# Altium schematic symbol library lib_datalogger.SchLib: 1246 symbols (part 5 of 16) (continued)
## CMP-007-00028-2 (continued)

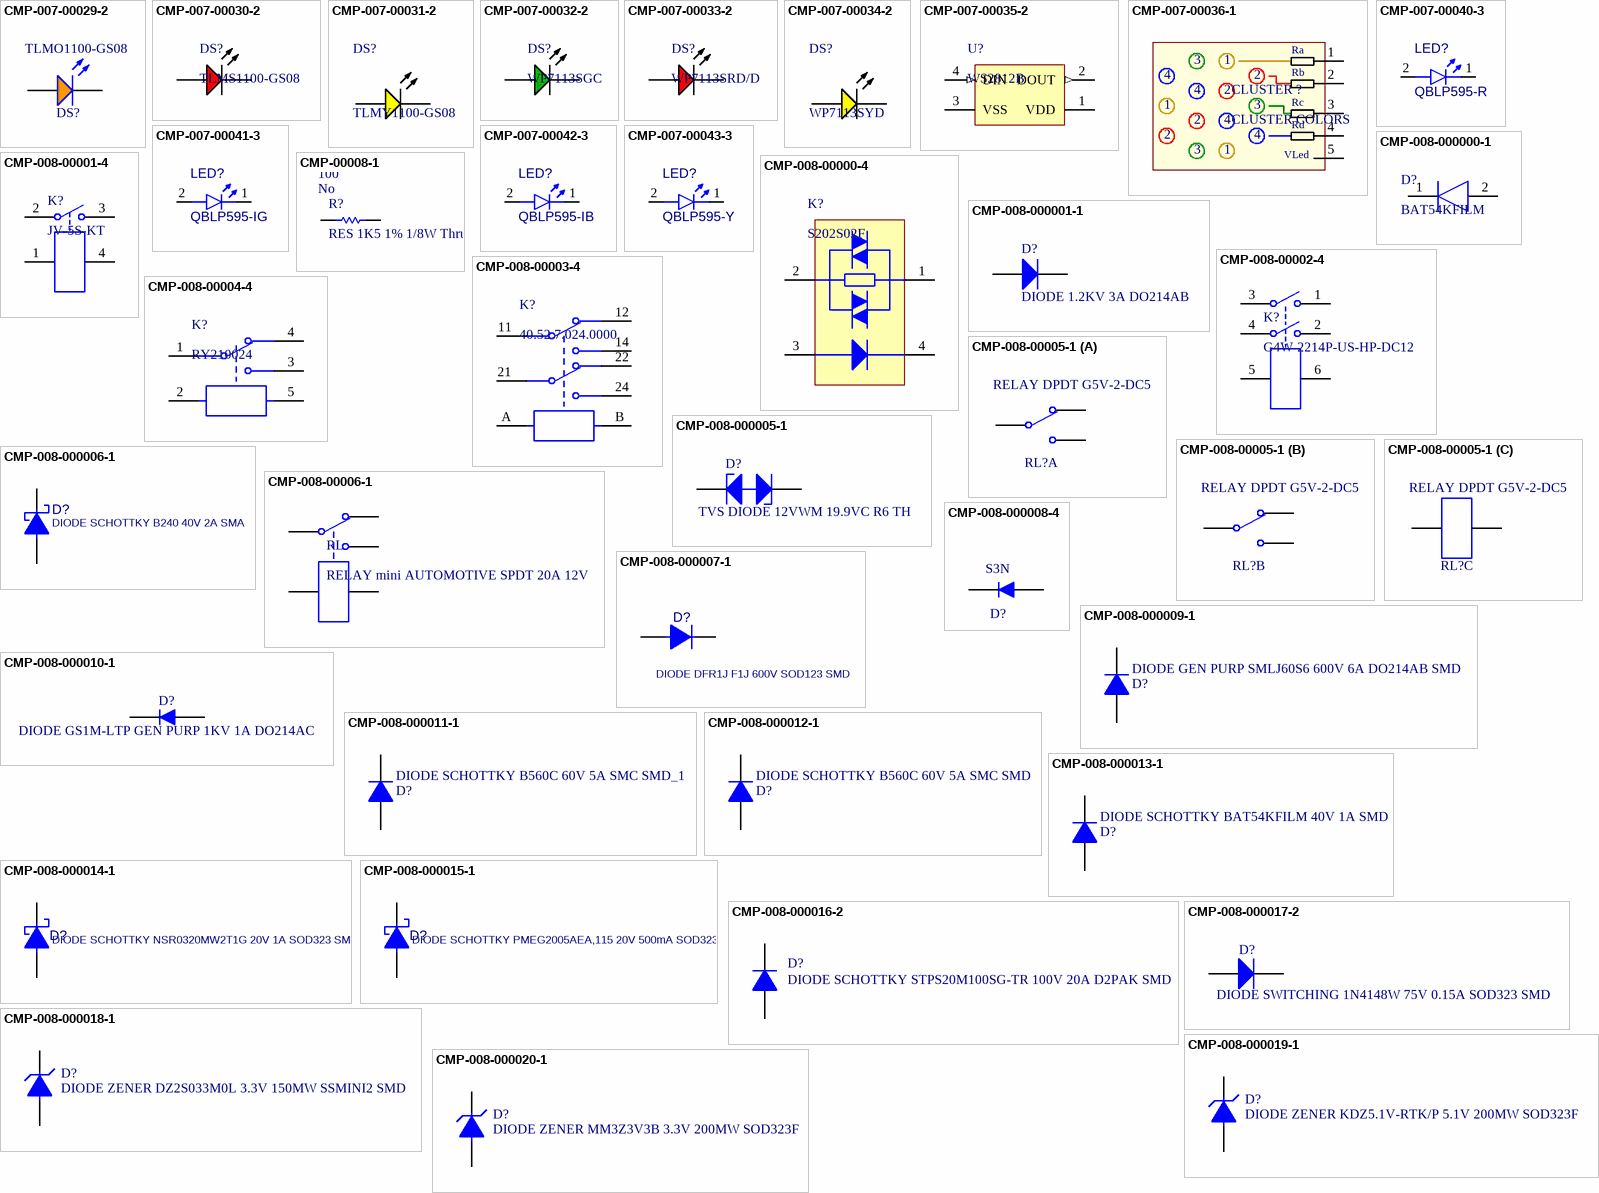
[diagram p15: symbols CMP-007-00029-2 to CMP-008-000020-1]

## CMP-007-00029-2
designator DS?, comment TLMO1100-GS08
Orange LED, 20 mA, 2.1 V, -40 to 100 degC, 2-Pin SMD (0603), RoHS, Tape and Reel; Manufacturer: Vishay Semiconductor; Lens Style: Diffused; Forward Current: 20mA; Viewing Angle: 160degrees; Nominal Vf: 2.1V; Power: 90mW; Luminous Intensity: 80mcd; Max Operating Temperature: 100°C; Manufacturer URL: http://www.vishay.com/; Datasheet URL: http://download.siliconexpert.com/pdfs/2016/8/7/12/43/26/667/vsh_/manual/379263299541529tlmb1100.pdf; Datasheet Version: Rev. 2.7, 03/2016; Illumination Colour: Orange; Package Quantity: 3000; Package Reference: 0603; Pins: 2; Min Operating Temperature: -40°C; Package Description: 2-Pin Surface Mount Device, Body 1.6 x 0.8 mm; RoHS Compliant: True; Case/Package: 0603; Mounting Technology: SM; Colour: Orange; Packaging: TapeandReel; Forward Voltage: 2.1V
footprint VISH-TLMX1100-2_V (SMD, 2-Leads, Body 1.6x0.8mm)
pins: 1 A, 2 K

## CMP-007-00030-2
designator DS?, comment TLMS1100-GS08
Red Led, 20mA, 2.1 V, -40 to 100 degC, 2-Pin SMD (0603), RoHS, Tape and Reel; Manufacturer: Vishay Semiconductor; Viewing Angle: 160degrees; Forward Voltage: 2.1V; Lens Style: Clear; Power: 90mW; Luminous Intensity: 63mcd; Datasheet Version: Rev. 2.7, 03/2016; Package Quantity: 3000; Colour: Red; Package Description: 2-Pin Surface Mount Device, Body 1.6 x 0.8 mm; Datasheet URL: http://www.vishay.com/docs/83173/tlmb1100.pdf; Package Reference: TLMX1100; Max Operating Temperature: 100°C; Mounting Technology: SM; Packaging: TapeandReel; Case/Package: 0603; Illumination Colour: Red; Forward Current: 20mA; Manufacturer URL: http://www.vishay.com/; RoHS Compliant: True; Min Operating Temperature: -40°C; Nominal Vf: 2.1V; Pins: 2
footprint VISH-TLMX1100_V (SMD, 2-Leads, Body 1.6x0.8mm)
pins: 1 A, 2 K

## CMP-007-00031-2
designator DS?, comment TLMY1100-GS08
Yellow LED, 20 mA, 2.1 V, -40 to 100 degC, 2-Pin SMD (0603), RoHS, Tape and Reel; Manufacturer: Vishay Semiconductor; Power: 90mW; Lens Style: Diffused; Nominal Vf: 2.1V; Forward Current: 20mA; Luminous Intensity: 80mcd; Viewing Angle: 160degrees; Manufacturer URL: http://www.vishay.com/; Package Reference: 0603; Packaging: TapeandReel; Case/Package: 0603; Datasheet Version: Rev. 2.7, 03/2016; Package Quantity: 3000; Forward Voltage: 2.1V; RoHS Compliant: True; Mounting Technology: SM; Datasheet URL: http://download.siliconexpert.com/pdfs/2016/8/7/12/43/26/667/vsh_/manual/379263299541529tlmb1100.pdf; Min Operating Temperature: -40°C; Pins: 2; Package Description: 2-Pin Surface Mount Device, Body 1.6 x 0.8 mm; Colour: Yellow; Max Operating Temperature: 100°C; Illumination Colour: Yellow
footprint VISH-TLMX1100-2_V (SMD, 2-Leads, Body 1.6x0.8mm)
pins: 1 A, 2 K

## CMP-007-00032-2
designator DS?, comment WP7113SGC
The Super Bright Green Source Color Device, 2.2 V, -40 to 85 degC, 2-Pin THD, RoHS, Tape and Reel; Manufacturer: Kingbright; Luminous Intensity: 200mcd; Nominal Vf: 2.2V; Viewing Angle: 20degrees; Lens Style: Clear; Mounting Technology: TH; Forward Voltage: 2.2V; Colour: Green; Package Quantity: 1000; Datasheet Version: Rev. 9B, 01/2015; RoHS Compliant: True; Case/Package: Radial; Package Description: 2-Pin Through Hole Device, Dia 5.9 mm, Body Length 8.6 mm; Packaging: Bulk; Illumination Colour: Green; Datasheet URL: http://www.kingbrightusa.com/images/catalog/SPEC/WP7113SGC.pdf; Package Reference: WP7113SGC
footprint KING-WP7113SGC_V (THD, 2-Leads, Dia 5.9mm, Body Length 8.6mm)
pins: 1 A, 2 K

## CMP-007-00033-2
designator DS?, comment WP7113SRD/D
The Super Bright Red Source Color Device, 1.85 V, -40 to 85 degC, 2-Pin THD, RoHS, Tape and Reel; Manufacturer: Kingbright; Nominal Vf: 1.85V; Luminous Intensity: 300mcd; Viewing Angle: 30degrees; Lens Style: Diffused; RoHS Compliant: True; Datasheet Version: Rev. 6A, 07/2016; Illumination Colour: Red; Case/Package: Radial; Package Reference: WP7113SRDD; Package Quantity: 500; Datasheet URL: http://www.kingbrightusa.com/images/catalog/SPEC/WP7113SRD-D.pdf; Colour: Red; Packaging: Bulk; Forward Voltage: 1.85V; Mounting Technology: TH; Package Description: 2-Pin Through Hole Device, Dia 5.9 mm, Body Length 8.6 mm
footprint KING-WP7113SRDD_V (THD, 2-Leads, Dia 5.9mm, Body Length 8.6mm)
pins: 1 A, 2 K

## CMP-007-00034-2
designator DS?, comment WP7113SYD
The Super Bright Yellow Source Color Device, 2 V, -40 to 85 degC, 2-Pin THD, RoHS, Tape and Reel; Manufacturer: Kingbright; Nominal Vf: 2V; Viewing Angle: 30degrees; Luminous Intensity: 600mcd; Forward Current: 20mA; Lens Style: Diffused; Datasheet Version: Rev. 7B, 01/2015; RoHS Compliant: True; Datasheet URL: http://www.kingbrightusa.com/images/catalog/SPEC/WP7113SYD.pdf; Illumination Colour: Yellow; Package Reference: WP7113SYD; Mounting Technology: TH; Package Quantity: 500; Packaging: Bulk; Package Description: 2-Pin Through Hole Device, Dia 5.9 mm, Body Length 8.6 mm; Case/Package: Radial; Colour: Yellow; Forward Voltage: 2V
footprint KING-WP7113SYD_V (THD, 2-Leads, Dia 5.9mm, Body Length 8.6mm)
pins: 1 A, 2 K

## CMP-007-00035-2
designator U?, comment WS2812B
Intelligent Control LED Integrated Light Source, 3.5 to 5.3 V, -25 to 80 degC, 4-Pin SMD, RoHS, Bulk; Manufacturer: Adafruit Industries; Datasheet URL: https://cdn-shop.adafruit.com/datasheets/WS2812B.pdf; Manufacturer URL: https://www.adafruit.com/; Datasheet Version: May-13; Case/Package: WS2812B; Mounting Technology: SM; RoHS Compliant: False; Package Description: 4-Pin Surface Mount Device, Body 5 x 5 mm, Pitch 3.3 mm; Package Reference: WS2812B
footprint ADAI-WS2812B_V (SMD, 4-Leads, Body 5x5mm, Pitch 3.3mm)
pins: 1 VDD (power) "Power supply LED", 2 DOUT (out) "Control data signal output", 3 VSS (power) "Ground", 4 DIN (in) "Control data signal input"

## CMP-007-00036-1
designator CLUSTER ?, comment CLUSTER COLORS
Round 503-B Series Led -amber Color, Full Rank, Ammo Pack, Minimum 30-DEGREES; Viewing Angle: 30°; Reverse Voltage: 5V; Luminous Intensity: 6000mcd; Illumination Color: Orange; Lens Transparency: Clear; Lens Color: Colorless; Number of LEDs: 1; Test Current: 20mA; Wavelength: 591nm; Power Dissipation: 130mW; Dominant Wavelength: 596nm; Lens Style: Dome,Round; Forward Voltage: 2.1V; Number of Pins: 2; Min Operating Temperature: -40°C; RoHS Compliant: Yes; Packaging: Tape and Reel; Package Quantity: 2500; Case/Package: Radial; Color: Orange; Depth: 5.8mm; Max Operating Temperature: 100°C; Height: 10.1mm; Number of Elements: 1; Forward Current: 20mA; Length: 5.8mm; Series: -; Mount: Through Hole; REACH SVHC: Unknown
footprint New footprint 1
pins: 1, 2, 3, 4, 5
text: Ra; Rb; Rc; Rd; VLed

## CMP-007-00040-3
designator LED?, comment QBLP595-R
Chip LED 0402, Red, 0.02 A, 2.0 to 2.5 V, -40 to 80 degC, 2-Pin SMD, RoHS, Tape and Reel; Colour: Red; RoHS Compliant: Yes; Case/Package: 0402; Pins: 2; Mounting Technology: SMT
footprint QTB-QBLP595_V (SMD, 2-Leads, Body 1x0.5mm)
footprint QTB-QBLP595_V (SMD, 2-Leads, Body 1x0.5mm)
pins: 1 K, 2 A

## CMP-007-00041-3
designator LED?, comment QBLP595-IG
Chip LED 0402, Green, 0.02 A, 3.1 to 3.7 V, -40 to 80 degC, 2-Pin SMD, RoHS, Tape and Reel; Case/Package: 0402; Colour: Green; Mounting Technology: SMT; Pins: 2; RoHS Compliant: Yes
footprint QTB-QBLP595_V (SMD, 2-Leads, Body 1x0.5mm)
footprint QTB-QBLP595_V (SMD, 2-Leads, Body 1x0.5mm)
pins: 1 K, 2 A

## CMP-007-00042-3
designator LED?, comment QBLP595-IB
Chip LED 0402, Blue, 0.02 A, 3.1 to 3.7 V, -40 to 80 degC, 2-Pin SMD, RoHS, Tape and Reel; RoHS Compliant: Yes; Colour: Blue; Pins: 2; Case/Package: 0402; Mounting Technology: SMT
footprint QTB-QBLP595_V (SMD, 2-Leads, Body 1x0.5mm)
footprint QTB-QBLP595_V (SMD, 2-Leads, Body 1x0.5mm)
pins: 1 K, 2 A

## CMP-007-00043-3
designator LED?, comment QBLP595-Y
Chip LED 0402, Yellow, 0.02 A, 3.1 to 3.7 V, -40 to 80 degC, 2-Pin SMD, RoHS, Tape and Reel; Mounting Technology: SMT; Case/Package: 0402; RoHS Compliant: Yes; Pins: 2; Colour: Yellow
footprint QTB-QBLP595_V (SMD, 2-Leads, Body 1x0.5mm)
footprint QTB-QBLP595_V (SMD, 2-Leads, Body 1x0.5mm)
pins: 1 K, 2 A

## CMP-008-000000-1
designator D?, comment BAT54KFILM
Diode; Manufacturer_Name: STMicroelectronics; Arrow Price/Stock: https://www.arrow.com/en/products/bat54kfilm/stmicroelectronics; Datasheet Link: http://www.st.com/web/en/resource/technical/document/datasheet/CD00001322.pdf; Source: mits.SchLib; Mouser Price/Stock: https://www.mouser.co.uk/ProductDetail/STMicroelectronics/BAT54KFILM/?qs=jZi1jxfVU95Y9ce6l3OT%252BA%3D%3D; Manufacturer_Part_Number: BAT54KFILM; Mouser Part Number: 511-BAT54KFILM; Design Item ID: BAT54KFILM; Arrow Part Number: BAT54KFILM; Height: 0.7mm
footprint SODFL1608X70N
footprint SODFL1608X70N
pins: 1 K, 2 A

## CMP-008-00000-4
designator K?, comment S202S02F
Zero Cross Type Triac Output SSR, 240 V, 8 A, -25 to 80 degC, 4-Pin THD, RoHS, Bulk; Manufacturer: Sharp; Max Ouput Current: 8A; Max Input Voltage: 1.4V; Mounting Technology: TH; Pins: 4; Package Description: 4-Pin Through Hole Device, Body 18.5 x 5.5 mm, Pitch 2.54 mm; RoHS Compliant: True; Datasheet Version: Apr-04; Package Quantity: 200; Datasheet URL: http://www.mouser.com/ds/2/365/s102s02_e-183210.pdf; Max Operating Temperature: 100°C; Package Reference: S202S02; Packaging: Rail/Tube; Output Current: 8A; Min Operating Temperature: -25°C; Case/Package: SIP
footprint SHRP-S202S02 (THD, 4-Leads, Body 5.7x18.7mm, Pitch 2.54mm)
pins: 1 OUTPUT, 2 OUTPUT, 3 INPUT(+), 4 INPUT(-)

## CMP-00008-1
designator R?, comment RES 1K5 1% 1/8W Thru-Hole  RoHS Compliant: No  Package Quantity: 100  Diameter: 2.39mm  Case/Package: Conformal  Max Operating Temperature: 175°C  Resistance: 1.5kR  Packaging: Bulk  Tolerance: 1%  Min Operating Temperature: -65°C
Res Metal Film 1.5K Ohm 1% 1/8W ±50ppm/°C 0.001% Conformal AXL Thru-Hole Bulk; Max Power Dissipation: 125mW; Temperature Coefficient: 50ppm/°C; Contact Plating: Tin,Lead; Lead Free: Contains Lead; Construction: Cylindrical; Termination: Axial; Failure Rate: 0.001%; Number of Terminations: 2; Military Standard: MIL-PRF-55182; Features: Moisture Resistant,Military,Weldable; Width: 2.39mm; Radiation Hardening: No; Resistor Type: Metal Film; Mount: Through Hole; Length: 7.62mm; Series: Military, MIL-PRF-55182/01, RNC55
footprint RESA60-630X240-2 (Axial Resistor, 2-Leads, Dia 2.4mm, Body Length 6.3mm)
pins: 1, 2

## CMP-008-000001-1
designator D?, comment DIODE 1.2KV 3A DO214AB
PartNumber: S3N; Fornecedor - sugerido: Digi-Key; Fabricante - sugerido: Fairchild Semiconductor; Observações: --; Design Item ID: DIODE 1.2KV 3A DO214AB; Datasheet: http://www.fairchildsemi.com/ds/S3/S3N.pdf; Source: mits.SchLib
footprint R-6
footprint R-6
pins: 1 A, 2 K

## CMP-008-00001-4
designator K?, comment JV-5S-KT
Power Relay, 5 A, 125 Ohm, -40 to 70 degc, 4-Pin THD, RoHS; Manufacturer: Fujitsu; Contact Form: SPST; Current Rating: 5A; Operate Time: 8ms; Datasheet URL: http://www.fujitsu.com/downloads/MICRO/fcai/relays/jv.pdf; Max Operating Temperature: 70°C; Pins: 4; Datasheet Version: Apr-12; RoHS Compliant: True; Mounting Technology: ThroughHole; Min Operating Temperature: -40°C; Package Reference: JV-5S-KT; Package Description: 4-Pin Through Hole Device, Body 17.5 x 10 mm, Picth 15.24 mm
footprint FJSU-JV-5S-KT_V (THD, 4-Leads, Body 17.5x10mm, Picth 15.24mm)
pins: 1, 2, 3, 4

## CMP-008-00002-4
designator K?, comment G4W-2214P-US-HP-DC12
DPST Power Relay,15 A, 12 V, -25 to 55 degC, 6-Pin THD, RoHS, Bulk; Manufacturer: Omron; Operate Time: 20ms; Current Rating: 15A; Mounting Technology: ThroughHole; Datasheet URL: https://datasheet.ciiva.com/15731/g4w-15731808.pdf; RoHS Compliant: True; Package Reference: G4W-2214P-US-HP-DC12; Package Description: 6-Pin Through Hole Device, Body 30.48 x 19.3 mm; Case/Package: DIP; Min Operating Temperature: -25°C; Datasheet Version: Oct-12; Pins: 6; Max Operating Temperature: 55°C; Contact Form: DPST
footprint OMRON-G4W-2214P-US-HP-DC12_V (Relay, 6-Leads, Body 30.48x19.3mm)
pins: 1, 2, 3, 4, 5, 6

## CMP-008-00003-4
designator K?, comment 40.52.7.024.0000
Miniature PCB/Plug-in DPDT Relay, 8 A, 250 V AC, -40 to 85 degC, 8-Pin THD; Manufacturer: Finder; Operate Time: 7ms; Current Rating: 8A; RoHS Compliant: True; Datasheet Version: Jun-16; Datasheet URL: http://gfinder.findernet.com//assets/Series/353/S40EN.pdf; Mounting Technology: ThroughHole; Package Description: 8-Pin Through Hole Device, Body 29 x 12.4 mm; Pins: 8; Max Operating Temperature: 85°C; Min Operating Temperature: -40°C; Package Reference: 40.52.7.024.0000; Contact Form: DPDT
footprint FIND-40.52.7.024.0000_V (Relay, 8-Leads, Body 29x12.4mm)
pins: 11, 12, 14, 21, 22, 24, A, B

## CMP-008-00004-4
designator K?, comment RY210024
General Purpose Relay, 24 VDC, 8 A, -40 to 70 degC, 5-Pin THD, RoHS, Bulk; Manufacturer: TE Connectivity; Operate Time: 9ms; Contact Form: SPDT; Current Rating: 10A; Datasheet URL: http://www.te.com/commerce/DocumentDelivery/DDEController?Action=showdoc&DocId=Data+Sheet%7FRYII%7F0115%7Fpdf%7FEnglish%7FENG_DS_RYII_0115.pdf%7F3-1393224-8; Datasheet Version: Rev. 0115, 01/2015; Max Operating Temperature: 70°C; Mounting Technology: ThroughHole; Min Operating Temperature: -40°C; Package Description: 5-Pin Through Hole Device, Body 28.5 x 10.1 mm; Pins: 5; Package Reference: RY210024; RoHS Compliant: True
footprint TECO-RY210024_V (THD, 5-Leads, Body 28.5x10.1mm)
pins: 1, 2, 3, 4, 5

## CMP-008-000005-1
designator D?, comment TVS DIODE 12VWM 19.9VC R6 TH
TVS DIODE 12VWM 19.9VC R6; Manufacturer: Micro Commercial Co; Manufacturer Part Number: 5KP12CA-TP; Bidirectional Channels: 1; Power - Peak Pulse: 5000W (5kW); Power Line Protection: No; Voltage - Breakdown (Min): 13.3V; Voltage - Reverse Standoff (Typ): 12V; Voltage - Clamping (Max) @ Ipp: 19.9V; Type: Zener; Supplier Device Package: R-6; Pricing 1: 1=1.92, 10=1.73, 25=1.5452, 100=1.3905, 250=1.236 (USD); Part Status: Active; Current - Peak Pulse (10/1000µs): -; Capacitance @ Frequency: -; Operating Temperature: -55°C ~ 175°C (TJ); Category: Circuit Protection; RoHS: RoHS Compliant; Design Item ID: TVS DIODE 12VWM 19.9VC R6 TH; Stock 1: 1395; ComponentLink1URL: http://www.mccsemi.com/up_pdf/5KP5.0(C)%20~5KP250(C)A%20(R-6).pdf; Source: mits.SchLib; Package / Case: R6, Axial; Mounting Type: Through Hole; Packaging: Cut Tape (CT); Unidirectional Channels: -; ComponentLink1Description: http://www.mccsemi.com/up_pdf/5KP5.0(C)%20~5KP250(C)A%20(R-6).pdf; Applications: General Purpose
footprint DO-214AA(SMB)
footprint R-6
pins: 1 A, 2 K

## CMP-008-00005-1
designator RL?, comment RELAY DPDT G5V-2-DC5
RELAY GENERAL PURPOSE DPDT 2A 5V / Signal Relay 5VDC 2A DPDT(20.5x10.1x11.5)mm THT; Voltage Rating (DC): 125V; Release Time: 3ms; Operate Time: 7ms; Approvals: UL,CSA; Coil Power: 500mW; Coil Type: Non-Latching; Coil Current: 100mA; Coil Resistance: 50R; Power Consumption: 150mW; PartNumber: G5V-2-DC5; Lead Free: Lead Free; Termination: PC Pin; Width: 10.1mm; Contact Material: Gold,Silver; Relay Type: General Purpose; Max Voltage Rating (DC): 125V; Length: 20.5mm; Manufacturer Part Number: G5V-2-DC5; Weight: 5g; Height: 11.5mm; Depth: 10.1mm; REACH SVHC: No SVHC; Radiation Hardening: No; Case/Package: DIP; Min Operating Temperature: -25°C; Contact Current Rating: 2A; Series: G5V-2; Package Quantity: 25; Max Current Rating: 2A; Packaging: Rail/Tube; Max Operating Temperature: 65°C; Throw Configuration: DPDT; Coil Voltage (DC): 5V; Max Voltage Rating (AC): 125V; Voltage Rating (AC): 125V; Mount: Through Hole; Power Rating: 500mW; Current Rating: 2A; Number of Pins: 8
footprint RELE DPDT
part A pins: 4, 6, 8
part B pins: 9, 11, 13
part C pins: 1, 16

## CMP-008-000006-1
designator D?, comment DIODE SCHOTTKY B240 40V 2A SMA
DIODE SCHOTTKY 40V 2A SMA; Manufacturer Part Number: B240A-13-F; Manufacturer: Diodes Incorporated; Current - Reverse Leakage @ Vr: 500µA @ 40V; eVendor#: B240A-FDICT-ND; eVendor: Digi-Key; Voltage - Forward (Vf) (Max) @ If: 500mV @ 2A; eVendorPrice: 0,54; Speed: Fast Recovery =< 500ns, > 200mA (Io); Capacitance @ Vr, F: 200pF @ 4V, 1MHz; MSRP: 0,10175; Operating Temperature - Junction: -65°C ~ 150°C; Voltage - DC Reverse (Vr) (Max): 40V; Reverse Recovery Time (trr): -; Source: mits.SchLib; Packaging: Cut Tape (CT); Supplier Device Package: SMA; RoHS: RoHS Compliant; Design Item ID: DIODE SCHOTTKY B240 40V 2A SMA; Stock 1: 190551; Diode Type: Schottky; Datasheet: http://www.diodes.com/datasheets/ds13004.pdf; Current - Average Rectified (Io): 2A; MOQ: 2500; Part#: B240A-13-F; Mounting Type: Surface Mount; ComponentLink1URL: http://www.diodes.com/_files/datasheets/ds13004.pdf; Category: Discrete Semiconductor Products; Pricing 1: 1=0.46, 10=0.346, 100=0.2156, 500=0.1474, 1000=0.1133 (USD); Package / Case: DO-214AC, SMA; ComponentLink1Description: http://www.diodes.com/_files/datasheets/ds13004.pdf
footprint DO-214AC (RM2000E-TP FOOTPRINT)
footprint DO-214AC (RM2000E-TP FOOTPRINT)
pins: A "Anode", K "Catode"

## CMP-008-00006-1
designator RL, comment RELAY mini AUTOMOTIVE SPDT 20A 12V
RELAY AUTOMOTIVE SPDT 20A 12V; Manufacturer Part Number: JJM1-12V; Coil Current: 53.3mA; Operate Time: 10ms; Power Consumption: 640mW; Coil Resistance: 225R; Max Voltage Rating (DC): 14V; Coil Type: Non-Latching; Length: 15.5mm; Contact Current Rating: 20A; Depth: 12mm; Series: JJM; Termination: PC Pin; Coil Voltage (DC): 12V; Lead Free: Lead Free; Throw Configuration: SPDT; Min Operating Temperature: -40°C; Packaging: Case; Mount: Through Hole; Max Operating Temperature: 85°C; Coil Power: 640mW; Release Time: 10ms; Contact Material: Silver,Cadmium; RoHS Compliant: Yes; Relay Type: Automotive; Package Quantity: 50; Number of Pins: 5; Voltage Rating (DC): 14V; Radiation Hardening: No; Weight: 5g
footprint New footprint 1
pins: 1, 2, 3, 4, 5

## CMP-008-000007-1
designator D?, comment DIODE DFR1J F1J 600V SOD123 SMD
DIODES - RECTIFIERS - FAST RECOVERY 600V 1A 1.3V @ 1A 250NS SOD-123F ROHS"; Manufacturer 1: MDD)icrodiode Electronics); Diode Type: RECTIFIERS; RoHS: RoHS Compliant; Mounting Type: Surface Mount; Part Status: Active; Packaging: Cut Tape (CT); Package / Case: SOD-123; Design Item ID: DIODE DFR1J F1J 600V SOD123 SMD; Voltage - DC Reverse (Vr) (Max): 600V; Category: Discrete Semiconductor Products; Manufacturer Part Number 1: DFR1J F1J; Source: mits.SchLib
footprint SOD-123
footprint SOD-123
pins: A "Anode", K "Catode"

## CMP-008-000008-4
designator D?, comment S3N
Rectifier Diode, Single, 1.2 kV, 3 A, 1.2 V, 100 A, 150 C; Manufacturer: Fairchild Semiconductor; Reverse Voltage: 1.2kV; Reverse Recovery Time: 2.5us; Max Reverse Current: 5uA; Natural Thermal Resistance: 13°C/W; eVendor#: S3NCT-ND; Peak Non-Repetitive Surge Current: 100A; Average Rectified Current: 3A; eVendor: Digi-Key; eVendorPrice: 0,53; MSRP: 0,14541; Forward Voltage: 1.2V; RoHS Compliant: Yes; Package Quantity: 3000; Max Repetitive Reverse Voltage (Vrrm): 1.2kV; Weight: 0.3g; Radiation Hardening: No; Length: 7.15mm; Max Operating Temperature: 150°C; Design Item ID: DIODE GEN PURP 1.2KV 3A DO214AB SMD; Observações: --; Width: 6.25mm; Max Surge Current: 100A; Part#: S3N; Mount: Surface Mount; Min Operating Temperature: -55°C; Max Forward Surge Current (Ifsm): 100A; MOQ: 1000; Max Reverse Voltage (DC): 1.2kV; Recovery Time: 2.5us; Number of Pins: 2; Element Configuration: Single; Datasheet: http://www.fairchildsemi.com/ds/S3/S3N.pdf; Forward Current: 3A; REACH SVHC: No SVHC; Height: 2.75mm; Packaging: Tape and Reel; Case/Package: DO-214AB
footprint DO-214AB(SMC) / R-6
footprint DO-214AB(SMC)
footprint DO-214AB(SMC)
pins: 1 K, 2 A

## CMP-008-000009-1
designator D?, comment DIODE GEN PURP SMLJ60S6 600V 6A DO214AB SMD
DIODE GEN PURP 600V 6A DO214AB; Manufacturer: Micro Commercial Co; Manufacturer Part Number: SMLJ60S6-TP; Current - Reverse Leakage @ Vr: 5µA @ 600V; Voltage - Forward (Vf) (Max) @ If: 1V @ 6A; Diode Type: Standard; Speed: Standard Recovery >500ns, > 200mA (Io); Capacitance @ Vr, F: 150pF @ 4V, 1MHz; Reverse Recovery Time (trr): -; Mounting Type: Surface Mount; Operating Temperature - Junction: -55°C ~ 150°C; Pricing 1: 1=1.01, 10=0.894, 25=0.8076, 100=0.7066, 250=0.62008, 500=0.54796, 1000=0.4326 (USD); Voltage - DC Reverse (Vr) (Max): 600V; Current - Average Rectified (Io): 6A; Stock 1: 8277; Category: Discrete Semiconductor Products; ComponentLink1URL: http://www.mccsemi.com/up_pdf/SMLJ60S05~SMLJ60S10(DO-214AB).pdf; RoHS: RoHS Compliant; Source: mits.SchLib; Part Status: Active; Package / Case: DO-214AB, SMC; Supplier Device Package: DO-214AB, (SMC); ComponentLink1Description: http://www.mccsemi.com/up_pdf/SMLJ60S05~SMLJ60S10(DO-214AB).pdf; Design Item ID: DIODE GEN PURP SMLJ60S6 600V 6A DO214AB SMD; Packaging: Cut Tape (CT)
footprint DO-214AB(SMC) / R-6
footprint DO-214AB(SMC)
footprint DO-214AB(SMC)
footprint DO-214AB(SMC) %2F R-6
pins: 1 K, 2 A

## CMP-008-000010-1
designator D?, comment DIODE GS1M-LTP GEN PURP 1KV 1A DO214AC
DIODE GEN PURP 1KV 1A DO214AC; Manufacturer: Micro Commercial Co; Diode Type: Standard; Speed: Standard Recovery >500ns, > 200mA (Io); Voltage - DC Reverse (Vr) (Max): 1000V (1kV); Voltage - Forward (Vf) (Max) @ If: 1V @ 1A; Current - Reverse Leakage @ Vr: 10µA @ 1000V; Capacitance @ Vr, F: 15pF @ 4V, 1MHz; Package / Case: DO-214AC, SMA; Operating Temperature - Junction: -55°C ~ 150°C; Current - Average Rectified (Io): 1A; Pricing 1: 1=0.28, 10=0.258, 25=0.1856, 100=0.1442, 250=0.0906, 500=0.0772, 1000=0.0526, 2500=0.0474 (USD); Reverse Recovery Time (trr): -; ComponentLink1Description: http://www.mccsemi.com/up_pdf/GS1A-L~GS1M-L(DO-214AC).pdf; ComponentLink1URL: http://www.mccsemi.com/up_pdf/GS1A-L~GS1M-L(DO-214AC).pdf; Stock 1: 49379; Source: mits.SchLib; Supplier Device Package: DO-214AC (SMA); Manufacturer Part Number: GS1M-LTP; Design Item ID: DIODE GS1M-LTP GEN PURP 1KV 1A DO214AC; Category: Discrete Semiconductor Products; Mounting Type: Surface Mount; RoHS: RoHS Compliant; Packaging: Cut Tape (CT)
footprint DO-214AC (RM2000E-TP FOOTPRINT)
footprint DO-214AC (RM2000E-TP FOOTPRINT)
pins: 1 K, 2 A

## CMP-008-000011-1
designator D?, comment DIODE SCHOTTKY B560C 60V 5A SMC SMD_1
DIODE SCHOTTKY 60V 5A SMC; Manufacturer: Diodes Incorporated; Manufacturer Part Number: B560C-13-F; Capacitance @ Vr, F: 300pF @ 4V, 1MHz; Current - Reverse Leakage @ Vr: 500µA @ 60V; Voltage - Forward (Vf) (Max) @ If: 700mV @ 5A; Speed: Fast Recovery =< 500ns, > 200mA (Io); Reverse Recovery Time (trr): -; Category: Discrete Semiconductor Products; Mounting Type: Surface Mount; RoHS: RoHS Compliant; ComponentLink1URL: http://www.diodes.com/_files/datasheets/ds13012.pdf; Design Item ID: DIODE SCHOTTKY B560C 60V 5A SMC SMD_1; Stock 1: 99255; ComponentLink1Description: http://www.diodes.com/_files/datasheets/ds13012.pdf; Voltage - DC Reverse (Vr) (Max): 60V; Diode Type: Schottky; Package / Case: DO-214AB, SMC; Operating Temperature - Junction: -55°C ~ 150°C; Supplier Device Package: SMC; Current - Average Rectified (Io): 5A; Packaging: Cut Tape (CT); Pricing 1: 1=0.5, 10=0.426, 100=0.3179, 500=0.2497, 1000=0.1925 (USD); Source: mits.SchLib
footprint DO-214AB(SMC) / R-6
footprint DO-214AB(SMC)
footprint DO-214AB(SMC)
footprint DO-214AB(SMC) %2F R-6
pins: 1 K, 2 A

## CMP-008-000012-1
designator D?, comment DIODE SCHOTTKY B560C 60V 5A SMC SMD
DIODE SCHOTTKY 60V 5A SMC; Manufacturer: Diodes Incorporated; Manufacturer Part Number: B560C-13-F; Current - Reverse Leakage @ Vr: 500µA @ 60V; Capacitance @ Vr, F: 300pF @ 4V, 1MHz; Speed: Fast Recovery =< 500ns, > 200mA (Io); Voltage - Forward (Vf) (Max) @ If: 700mV @ 5A; Pricing 1: 1=0.5, 10=0.426, 100=0.3179, 500=0.2497, 1000=0.1925 (USD); Current - Average Rectified (Io): 5A; Diode Type: Schottky; Supplier Device Package: SMC; Category: Discrete Semiconductor Products; RoHS: RoHS Compliant; Reverse Recovery Time (trr): -; Mounting Type: Surface Mount; Stock 1: 99255; Voltage - DC Reverse (Vr) (Max): 60V; Packaging: Cut Tape (CT); Design Item ID: DIODE SCHOTTKY B560C 60V 5A SMC SMD; ComponentLink1Description: http://www.diodes.com/_files/datasheets/ds13012.pdf; Operating Temperature - Junction: -55°C ~ 150°C; Package / Case: DO-214AB, SMC; ComponentLink1URL: http://www.diodes.com/_files/datasheets/ds13012.pdf; Source: mits.SchLib
footprint DO-214AB(SMC) / R-6
footprint DO-214AB(SMC)
footprint DO-214AB(SMC)
footprint DO-214AB(SMC) %2F R-6
pins: 1 K, 2 A

## CMP-008-000013-1
designator D?, comment DIODE SCHOTTKY BAT54KFILM 40V 1A SMD
BAT54KFILM Schottky 40V SOD-523 Diodes; Manufacturer: STMicroelectronics; Max Reverse Current: 100uA; Average Rectified Current: 300mA; Max Reverse Leakage Current: 1uA; Recovery Time: 5ns; Element Configuration: Single; Capacitance: 7pF; Polarity: Standard; Forward Voltage: 900mV; Min Operating Temperature: -40°C; Max Repetitive Reverse Voltage (Vrrm): 40V; Width: 0.8mm; Lead Free: Lead Free; Number of Pins: 2; Max Surge Current: 1A; Mount: Surface Mount; Height: 0.6mm; Manufacturer Part Number: BAT54KFILM; Max Forward Surge Current (Ifsm): 1A; Voltage Rating (DC): 40V; ComponentLink1URL: STMicroelectronics-BAT54KFILM_C283259.pdf; Max Reverse Voltage (DC): 40V; Max Operating Temperature: 150°C; Contact Plating: Tin,Matte; Category: Rectifier Diodes; Package Quantity: 1; REACH SVHC: No SVHC; Peak Non-Repetitive Surge Current: 1A; Radiation Hardening: No; Reverse Recovery Time: 5ns; Output Current: 300mA; Length: 1.2mm; Design Item ID: DIODE SCHOTTKY BAT54KFILM 40V 1A SMD; Packaging: Tape and Reel; Source: mits.SchLib; ComponentLink1Description: STMicroelectronics-BAT54KFILM_C283259.pdf; Forward Current: 300mA; Current Rating: 300mA
footprint DO-214AB(SMC) / R-6
footprint DO-214AB(SMC)
footprint SC-79, SOD-523
pins: 1 K, 2 A

## CMP-008-000014-1
designator D?, comment DIODE SCHOTTKY NSR0320MW2T1G 20V 1A SOD323 SMD
DIODE SCHOTTKY 20V 1A SOD323; Manufacturer: ON Semiconductor; Capacitance @ Vr, F: 29pF @ 5V, 1MHz; Speed: Fast Recovery =< 500ns, > 200mA (Io); Current - Reverse Leakage @ Vr: 50µA @ 15V; Current - Average Rectified (Io): 1A (DC); Voltage - Forward (Vf) (Max) @ If: 500mV @ 900mA; Pricing 1: 1=0.4, 10=0.298, 100=0.1689, 500=0.11188, 1000=0.08577 (USD); Design Item ID: DIODE SCHOTTKY NSR0320MW2T1G 20V 1A SOD323 SMD; Manufacturer Part Number: NSR0320MW2T1G; Supplier Device Package: SOD-323; ComponentLink1URL: http://www.onsemi.com/pub_link/Collateral/NSR0320MW2T1-D.PDF; Packaging: Cut Tape (CT); Package / Case: SC-76, SOD-323; ComponentLink1Description: http://www.onsemi.com/pub_link/Collateral/NSR0320MW2T1-D.PDF; Reverse Recovery Time (trr): -; Voltage - DC Reverse (Vr) (Max): 20V; RoHS: RoHS Compliant; Mounting Type: Surface Mount; Diode Type: Schottky; Category: Discrete Semiconductor Products; Operating Temperature - Junction: -55°C ~ 125°C; Part Status: Active; Stock 1: 617; Source: mits.SchLib
footprint SOD-323
pins: A "Anode", K "Catode"

## CMP-008-000015-1
designator D?, comment DIODE SCHOTTKY PMEG2005AEA,115 20V 500mA SOD323
DIODE SCHOTTKY 20V 500MA SOD323; Manufacturer: Nexperia USA Inc.; Current - Reverse Leakage @ Vr: 200µA @ 20V; Voltage - Forward (Vf) (Max) @ If: 390mV @ 500mA; Current - Average Rectified (Io): 500mA (DC); Speed: Fast Recovery =< 500ns, > 200mA (Io); Capacitance @ Vr, F: 80pF @ 1V, 1MHz; Pricing 1: 1=0.44, 10=0.332, 100=0.2071, 500=0.14168, 1000=0.10898 (USD); Design Item ID: DIODE SCHOTTKY PMEG2005AEA,115 20V 500mA SOD323; Reverse Recovery Time (trr): -; Mounting Type: Surface Mount; Stock 1: 17754; Package / Case: SC-76, SOD-323; Packaging: Cut Tape (CT); Source: mits.SchLib; Category: Discrete Semiconductor Products; RoHS: RoHS Compliant; Part Status: Active; Diode Type: Schottky; ComponentLink1Description: http://assets.nexperia.com/documents/data-sheet/PMEG2005AEA_3005_4005.pdf; Operating Temperature - Junction: 150°C (Max); Supplier Device Package: SOD-323; ComponentLink1URL: http://assets.nexperia.com/documents/data-sheet/PMEG2005AEA_3005_4005.pdf; Manufacturer Part Number: PMEG2005AEA,115; Voltage - DC Reverse (Vr) (Max): 20V
footprint SOD-323
footprint SOD-323
pins: A "Anode", K "Catode"

## CMP-008-000016-2
designator D?, comment DIODE SCHOTTKY STPS20M100SG-TR 100V 20A D2PAK SMD
DIODE SCHOTTKY 100V 20A D2PAK; Manufacturer: STMicroelectronics; Speed: Fast Recovery =< 500ns, > 200mA (Io); Current - Reverse Leakage @ Vr: 40µA @ 100V; Voltage - Forward (Vf) (Max) @ If: 850mV @ 20A; Pricing 1: 1=2.78, 10=2.495, 100=2.0017, 500=1.6452 (USD); Voltage - DC Reverse (Vr) (Max): 100V; Manufacturer Part Number: STPS20M100SG-TR; Mounting Type: Surface Mount; Reverse Recovery Time (trr): -; Operating Temperature - Junction: 150°C (Max); Stock 1: 2871; ComponentLink1Description: http://www.st.com/content/ccc/resource/technical/document/datasheet/group2/8f/d3/41/ea/82/b2/4b/5a/CD00228904/files/CD00228904.pdf/jcr:content/translations/en.CD00228904.pdf; Packaging: Cut Tape (CT); Current - Average Rectified (Io): 20A; Design Item ID: DIODE SCHOTTKY STPS20M100SG-TR 100V 20A D2PAK SMD; Package / Case: TO-263-3, D²Pak (2 Leads + Tab), TO-263AB; RoHS: RoHS Compliant; Part Status: Active; ComponentLink1URL: http://www.st.com/content/ccc/resource/technical/document/datasheet/group2/8f/d3/41/ea/82/b2/4b/5a/CD00228904/files/CD00228904.pdf/jcr:content/translations/en.CD00228904.pdf; Source: mits.SchLib; Diode Type: Schottky; Capacitance @ Vr, F: -; Supplier Device Package: D2PAK; Category: Discrete Semiconductor Products
footprint TO263-3 (D²Pak (2 Leads + Tab))
footprint TO263-3 (D²Pak (2 Leads + Tab))
pins: 1 A1, 2 K2, 3 A3